# Altium footprint library Miscellaneous C_nn.PcbLib: 416 footprints (part 3 of 26)
Each footprint in its own frame and in the unit in brackets; x right, y up, seen from the top. Pads: shape width x height; smd on the part's side, far side on the other; paste and mask are expansions set on the pad; w line width, h text height; cw(c..) or ccw(c..) is an arc to the next point about the centre after c.
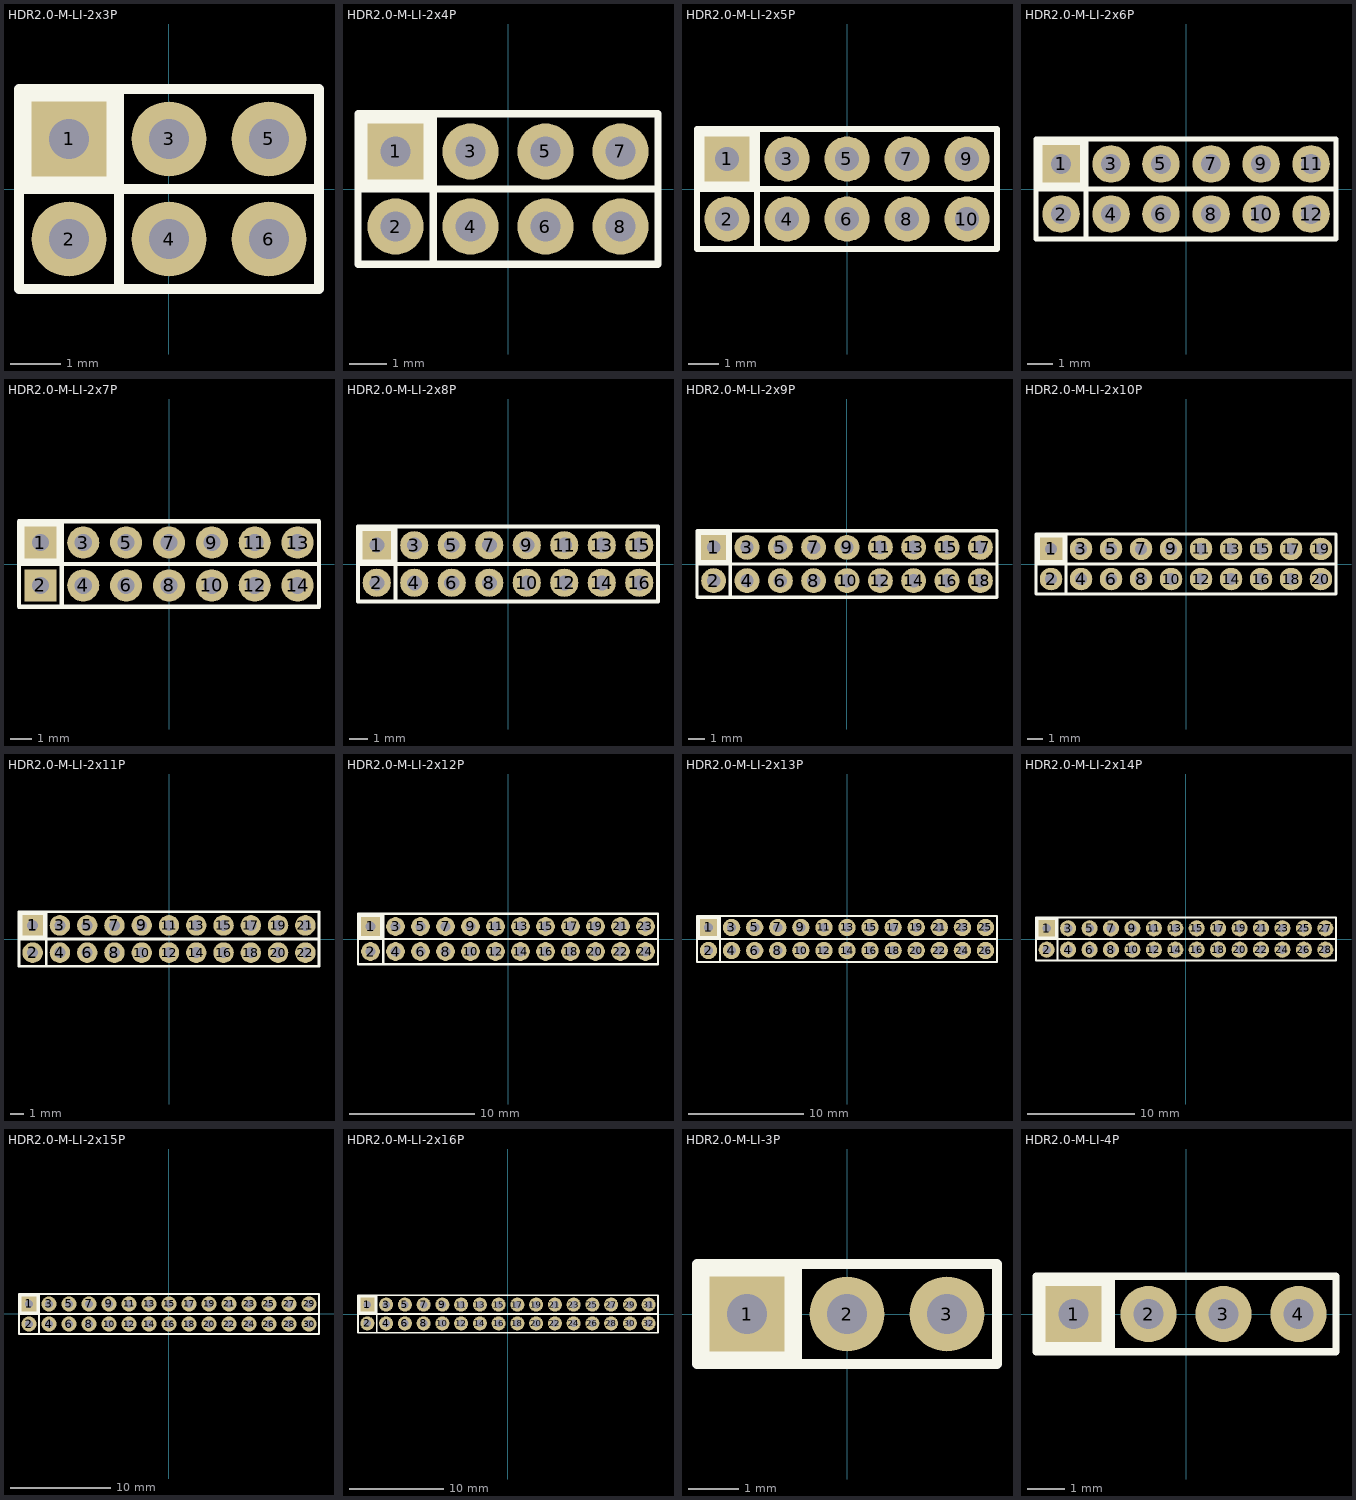
[diagram p2: the footprints below, top view; thin cyan lines are the x and y axes]

## HDR2.0-M-LI-2x3P [mm] "直插，脚距：2.0mm"
pads (6):
  rect 1.5x1.5 hole 0.8: 1(-2,1)
  round 1.5 hole 0.8: 2(-2,-1) 3(0,1) 4(0,-1) 5(2,1) 6(2,-1)
Top Overlay:
  rectangle: -3,0 -1,2
  lines w0.2: -1,-2 -1,0 -1,2 ; -3,0 3,0 ; -3,0 -3,2 3,2 3,0 ; -3,0 3,0 ; -3,0 -3,-2 3,-2 3,0
3D body "HDR2.0-M-LI-2x3P.STEP": height 5.5, standoff -2.27, extent -3,-2 3,2

## HDR2.0-M-LI-2x4P [mm] "直插，脚距：2.0mm"
pads (8):
  rect 1.5x1.5 hole 0.8: 1(-3,1)
  round 1.5 hole 0.8: 2(-3,-1) 3(-1,1) 4(-1,-1) 5(1,1) 6(1,-1) 7(3,1) 8(3,-1)
Top Overlay:
  rectangle: -4,0 -2,2
  lines w0.2: -2,-2 -2,0 -2,2 ; -4,0 4,0 ; -4,0 -4,2 4,2 4,0 ; -4,0 4,0 ; -4,0 -4,-2 4,-2 4,0
3D body "HDR2.0-M-LI-2x4P.STEP": height 5.5, standoff -2.27, extent -4,-2 4,2

## HDR2.0-M-LI-2x5P [mm] "直插，脚距：2.0mm"
pads (10):
  rect 1.5x1.5 hole 0.8: 1(-4,1)
  round 1.5 hole 0.8: 2(-4,-1) 3(-2,1) 4(-2,-1) 5(0,1) 6(0,-1) 7(2,1) 8(2,-1) 9(4,1) 10(4,-1)
Top Overlay:
  rectangle: -5,0 -3,2
  lines w0.2: -3,-2 -3,0 -3,2 ; -5,0 -5,-2 5,-2 5,0 ; -5,0 5,0 ; -5,0 -5,2 5,2 5,0 ; -5,0 5,0
3D body "HDR2.0-M-LI-2x5P.STEP": height 5.5, standoff -2.27, extent -5,-2 5,2

## HDR2.0-M-LI-2x6P [mm] "直插，脚距：2.0mm"
pads (12):
  rect 1.5x1.5 hole 0.8: 1(-5,1)
  round 1.5 hole 0.8: 2(-5,-1) 3(-3,1) 4(-3,-1) 5(-1,1) 6(-1,-1) 7(1,1) 8(1,-1) 9(3,1) 10(3,-1) 11(5,1) 12(5,-1)
Top Overlay:
  rectangle: -6,0 -4,2
  lines w0.2: -4,-2 -4,0 -4,2 ; -6,0 6,0 ; -6,0 -6,-2 6,-2 6,0 ; -6,0 6,0 ; -6,0 -6,2 6,2 6,0
3D body "HDR2.0-M-LI-2x6P.STEP": height 5.5, standoff -2.27, extent -6,-2 6,2

## HDR2.0-M-LI-2x7P [mm] "直插，脚距：2.0mm"
pads (14):
  rect 1.5x1.5 hole 0.8: 1(-6,1) 2(-6,-1)
  round 1.5 hole 0.8: 3(-4,1) 4(-4,-1) 5(-2,1) 6(-2,-1) 7(0,1) 8(0,-1) 9(2,1) 10(2,-1) 11(4,1) 12(4,-1) 13(6,1) 14(6,-1)
Top Overlay:
  rectangle: -7,0 -5,2
  lines w0.2: -5,-2 -5,0 -5,2 ; -7,0 7,0 ; -7,0 -7,2 7,2 7,0 ; -7,0 7,0 ; -7,0 -7,-2 7,-2 7,0
3D body "HDR2.0-M-LI-2x7P.STEP": height 5.5, standoff -2.27, extent -7,-2 7,2

## HDR2.0-M-LI-2x8P [mm] "直插，脚距：2.0mm"
pads (16):
  rect 1.5x1.5 hole 0.8: 1(-7,1)
  round 1.5 hole 0.8: 2(-7,-1) 3(-5,1) 4(-5,-1) 5(-3,1) 6(-3,-1) 7(-1,1) 8(-1,-1) 9(1,1) 10(1,-1) 11(3,1) 12(3,-1) 13(5,1) 14(5,-1) 15(7,1) 16(7,-1)
Top Overlay:
  rectangle: -8,0 -6,2
  lines w0.2: -6,-2 -6,0 -6,2 ; -8,0 -8,-2 8,-2 8,0 ; -8,0 8,0 ; -8,0 8,0 ; -8,0 -8,2 8,2 8,0
3D body "HDR2.0-M-LI-2x8P.STEP": height 5.5, standoff -2.27, extent -8,-2 8,2

## HDR2.0-M-LI-2x9P [mm] "直插，脚距：2.0mm"
pads (18):
  rect 1.5x1.5 hole 0.8: 1(-8,1)
  round 1.5 hole 0.8: 2(-8,-1) 3(-6,1) 4(-6,-1) 5(-4,1) 6(-4,-1) 7(-2,1) 8(-2,-1) 9(0,1) 10(0,-1) 11(2,1) 12(2,-1) 13(4,1) 14(4,-1) 15(6,1) 16(6,-1) 17(8,1) 18(8,-1)
Top Overlay:
  rectangle: -9,0 -7,2
  lines w0.2: -7,-2 -7,0 -7,2 ; -9,0 -9,-2 9,-2 9,0 ; -9,0 9,0 ; -9,0 -9,2 9,2 9,0 ; -9,0 9,0
3D body "HDR2.0-M-LI-2x9P.STEP": height 5.5, standoff -2.27, extent -9,-2 9,2

## HDR2.0-M-LI-2x10P [mm] "直插，脚距：2.0mm"
pads (20):
  rect 1.5x1.5 hole 0.8: 1(-9,1)
  round 1.5 hole 0.8: 2(-9,-1) 3(-7,1) 4(-7,-1) 5(-5,1) 6(-5,-1) 7(-3,1) 8(-3,-1) 9(-1,1) 10(-1,-1) 11(1,1) 12(1,-1) 13(3,1) 14(3,-1) 15(5,1) 16(5,-1) 17(7,1) 18(7,-1) 19(9,1) 20(9,-1)
Top Overlay:
  rectangle: -10,0 -8,2
  lines w0.2: -8,-2 -8,0 -8,2 ; -10,0 -10,-2 10,-2 10,0 ; -10,0 10,0 ; -10,0 10,0 ; -10,0 -10,2 10,2 10,0
3D body "HDR2.0-M-LI-2x10P.STEP": height 5.5, standoff -2.27, extent -10,-2 10,2

## HDR2.0-M-LI-2x11P [mm] "直插，脚距：2.0mm"
pads (22):
  rect 1.5x1.5 hole 0.8: 1(-10,1)
  round 1.5 hole 0.8: 2(-10,-1) 3(-8,1) 4(-8,-1) 5(-6,1) 6(-6,-1) 7(-4,1) 8(-4,-1) 9(-2,1) 10(-2,-1) 11(0,1) 12(0,-1) 13(2,1) 14(2,-1) 15(4,1) 16(4,-1) 17(6,1) 18(6,-1) 19(8,1) 20(8,-1) 21(10,1) 22(10,-1)
Top Overlay:
  rectangle: -11,0 -9,2
  lines w0.2: -9,-2 -9,0 -9,2 ; 11,0 -11,0 ; -11,0 -11,-2 11,-2 11,2 -11,2 -11,0
3D body "HDR2.0-M-LI-2x11P.STEP": height 5.5, standoff -2.27, extent -11,-2 11,2

## HDR2.0-M-LI-2x12P [mm] "直插，脚距：2.0mm"
pads (24):
  rect 1.5x1.5 hole 0.8: 1(-11,1)
  round 1.5 hole 0.8: 2(-11,-1) 3(-9,1) 4(-9,-1) 5(-7,1) 6(-7,-1) 7(-5,1) 8(-5,-1) 9(-3,1) 10(-3,-1) 11(-1,1) 12(-1,-1) 13(1,1) 14(1,-1) 15(3,1) 16(3,-1) 17(5,1) 18(5,-1) 19(7,1) 20(7,-1) 21(9,1) 22(9,-1) 23(11,1) 24(11,-1)
Top Overlay:
  rectangle: -12,0 -10,2
  lines w0.2: -10,-2 -10,0 -10,2 ; 12,0 -12,0 ; -12,0 -12,-2 12,-2 12,2 -12,2 -12,0
3D body "HDR2.0-M-LI-2x12P.STEP": height 5.5, standoff -2.27, extent -12,-2 12,2

## HDR2.0-M-LI-2x13P [mm] "直插，脚距：2.0mm"
pads (26):
  rect 1.5x1.5 hole 0.8: 1(-12,1)
  round 1.5 hole 0.8: 2(-12,-1) 3(-10,1) 4(-10,-1) 5(-8,1) 6(-8,-1) 7(-6,1) 8(-6,-1) 9(-4,1) 10(-4,-1) 11(-2,1) 12(-2,-1) 13(0,1) 14(0,-1) 15(2,1) 16(2,-1) 17(4,1) 18(4,-1) 19(6,1) 20(6,-1) 21(8,1) 22(8,-1) 23(10,1) 24(10,-1) 25(12,1) 26(12,-1)
Top Overlay:
  rectangle: -13,0 -11,2
  lines w0.2: -11,-2 -11,0 -11,2 ; 13,0 -13,0 ; -13,0 -13,2 13,2 13,-2 -13,-2 -13,0
3D body "HDR2.0-M-LI-2x13P.STEP": height 5.5, standoff -2.27, extent -13,-2 13,2

## HDR2.0-M-LI-2x14P [mm] "直插，脚距：2.0mm"
pads (28):
  rect 1.5x1.5 hole 0.8: 1(-13,1)
  round 1.5 hole 0.8: 2(-13,-1) 3(-11,1) 4(-11,-1) 5(-9,1) 6(-9,-1) 7(-7,1) 8(-7,-1) 9(-5,1) 10(-5,-1) 11(-3,1) 12(-3,-1) 13(-1,1) 14(-1,-1) 15(1,1) 16(1,-1) 17(3,1) 18(3,-1) 19(5,1) 20(5,-1) 21(7,1) 22(7,-1) 23(9,1) 24(9,-1) 25(11,1) 26(11,-1) 27(13,1) 28(13,-1)
Top Overlay:
  rectangle: -14,0 -12,2
  lines w0.2: -12,-2 -12,0 -12,2 ; 14,0 -14,0 ; -14,0 -14,2 14,2 14,-2 -14,-2 -14,0
3D body "HDR2.0-M-LI-2x14P.STEP": height 5.5, standoff -2.27, extent -14,-2 14,2

## HDR2.0-M-LI-2x15P [mm] "直插，脚距：2.0mm"
pads (30):
  rect 1.5x1.5 hole 0.8: 1(-14,1)
  round 1.5 hole 0.8: 2(-14,-1) 3(-12,1) 4(-12,-1) 5(-10,1) 6(-10,-1) 7(-8,1) 8(-8,-1) 9(-6,1) 10(-6,-1) 11(-4,1) 12(-4,-1) 13(-2,1) 14(-2,-1) 15(0,1) 16(0,-1) 17(2,1) 18(2,-1) 19(4,1) 20(4,-1) 21(6,1) 22(6,-1) 23(8,1) 24(8,-1) 25(10,1) 26(10,-1) 27(12,1) 28(12,-1) 29(14,1) 30(14,-1)
Top Overlay:
  rectangle: -15,0 -13,2
  lines w0.2: -13,-2 -13,0 -13,2 ; 15,0 -15,0 ; -15,0 -15,2 15,2 15,-2 -15,-2 -15,0
3D body "HDR2.0-M-LI-2x15P.STEP": height 5.5, standoff -2.27, extent -15,-2 15,2

## HDR2.0-M-LI-2x16P [mm] "直插，脚距：2.0mm"
pads (32):
  rect 1.5x1.5 hole 0.8: 1(-15,1)
  round 1.5 hole 0.8: 2(-15,-1) 3(-13,1) 4(-13,-1) 5(-11,1) 6(-11,-1) 7(-9,1) 8(-9,-1) 9(-7,1) 10(-7,-1) 11(-5,1) 12(-5,-1) 13(-3,1) 14(-3,-1) 15(-1,1) 16(-1,-1) 17(1,1) 18(1,-1) 19(3,1) 20(3,-1) 21(5,1) 22(5,-1) 23(7,1) 24(7,-1) 25(9,1) 26(9,-1) 27(11,1) 28(11,-1) 29(13,1) 30(13,-1) 31(15,1) 32(15,-1)
Top Overlay:
  rectangle: -16,0 -14,2
  lines w0.2: -14,-2 -14,0 -14,2 ; 16,0 -16,0 ; -16,0 -16,-2 16,-2 16,2 -16,2 -16,0
3D body "HDR2.0-M-LI-2x16P.STEP": height 5.5, standoff -2.27, extent -16,-2 16,2

## HDR2.0-M-LI-3P [mm] "直插排母，脚距：2.0mm"
pads (3):
  rect 1.5x1.5 hole 0.8: 1(-2,0)
  round 1.5 hole 0.8: 2(0,0) 3(2,0)
Top Overlay:
  rectangle: -3,-1 -1,1
  lines w0.2: -1,-1 -1,1 ; -3,-1 3,-1 3,1 -3,1 -3,-1
3D body "HDR2.0-M-LI-3P.STEP": height 5.5, standoff -2.27, extent -3,-1 3,1

## HDR2.0-M-LI-4P [mm] "直插排母，脚距：2.0mm"
pads (4):
  rect 1.5x1.5 hole 0.8: 1(-3,0)
  round 1.5 hole 0.8: 2(-1,0) 3(1,0) 4(3,0)
Top Overlay:
  rectangle: -4,-1 -2,1
  lines w0.2: -2,-1 -2,1 ; -4,-1 -4,1 4,1 4,-1 -4,-1
3D body "HDR2.0-M-LI-4P.STEP": height 5.5, standoff -2.27, extent -4,-1 4,1